# Altium schematic symbol library TI Amplifiers and Linear Special Function Amplifier.SchLib: 708 symbols (part 25 of 34)
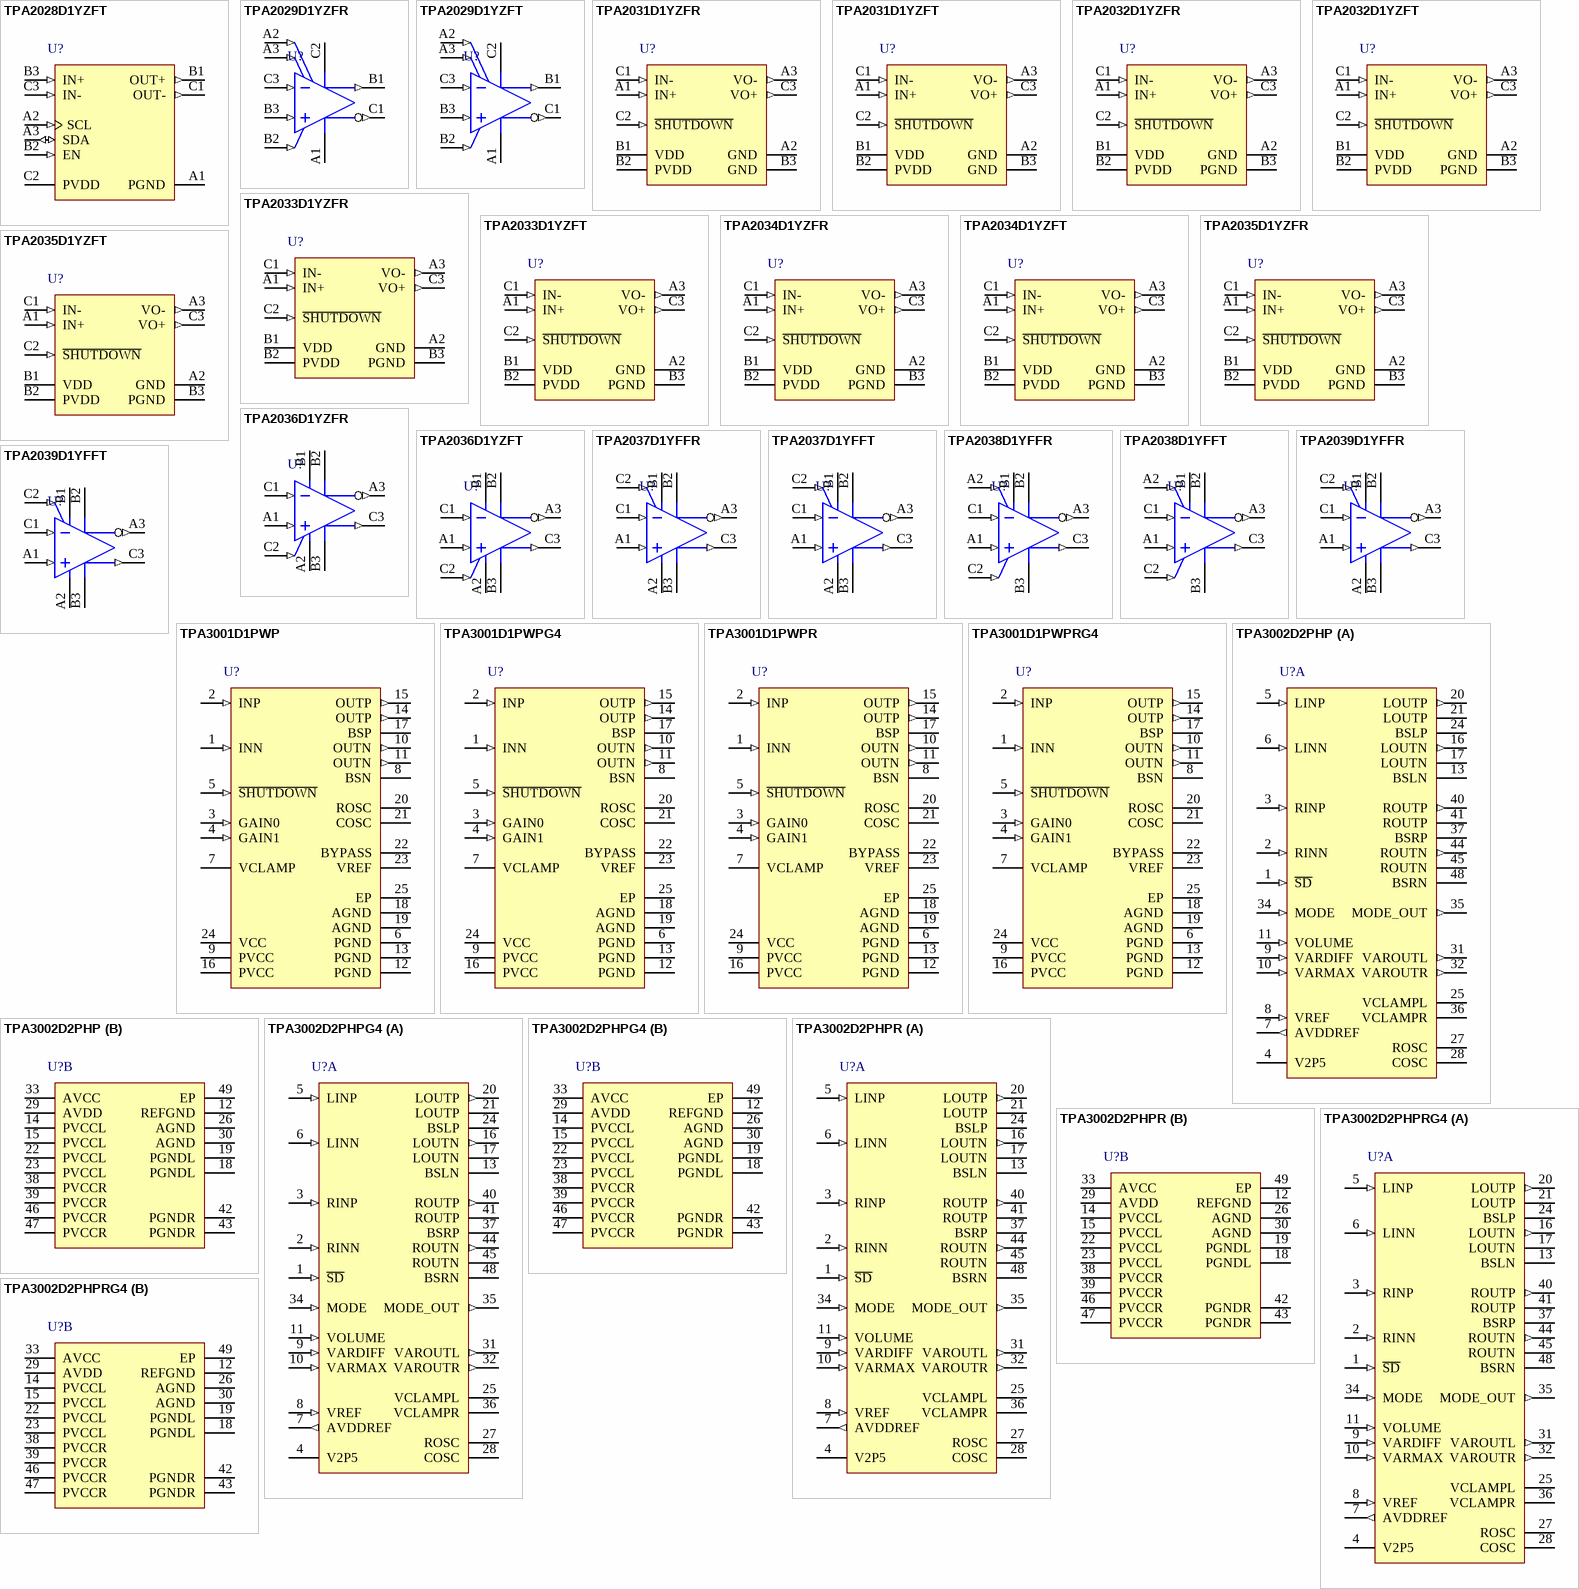
[diagram p63: symbols TPA2028D1YZFT to TPA3002D2PHPRG4]

## TPA2036D1YZFT
designator U?
2.5-W Mono Class-D Audio Amplifier with Variable Gain and Short Circuit Auto-Recovery, -40 to 85 degC, 9-pin BGA (YZF9), Green (RoHS & no Sb/Br); Manufacturer: Texas Instruments; PartNumber: TPA2036D1YZFT; Output Power(W): 2.5; PSRR(dB): -75; SubFamily: Dynamic Speaker; Supply Max(Max)(Volt): 5.5; DatasheetVersion: SLOS589; PackageVersion: 4205058-4/P, 07/2013; PackageReference: YZF9; PackageDescription: 9-Ball Silicon Grid Array, Body 1.625 x 1.625 mm, Pitch 0.5 mm; Supplier 1: Digi-Key; Supplier Part Number 1: 296-32456-2-ND; Supplier 2: Digi-Key; Supplier Part Number 2: 296-32456-1-ND; Supplier 3: Digi-Key; Supplier Part Number 3: 296-32456-6-ND; Supplier 4: Newark; Supplier Part Number 4: 19P7477; Supplier 5: Newark; Supplier Part Number 5: 08X6508; Supplier 6: Mouser; Supplier Part Number 6: 595-TPA2036D1YZFT; Eco-Plan: Green (RoHS & no Sb/Br); Speaker Amp Type: Class-D; Speaker Channels: Mono; Supply Min(Min)(Volt): 2.5; Mounting Technology: Surface Mount; ComponentLink1Description: Manufacturer URL; ComponentLink1URL: http://www.ti.com/; ComponentLink2Description: Datasheet; ComponentLink2URL: http://www.ti.com/general/docs/lit/getliterature.tsp?genericPartNumber=TPA2036D1&fileType=pdf; ComponentLink3Description: Package Specification; ComponentLink3URL: http://www.ti.com/lit/ml/mxbg027m/mxbg027m.pdf
footprint TI-YZF9 (BGA, 9-Leads, Body 1.6245x1.6245mm, Pitch 0.5mm)
pins: A1 IN+ (in) "Positive differential input", A2 GND (power) "High-current ground", A3 VO- (out) "Negative BTL output", B1 VDD (power) "Power supply", B2 VDD (power) "Power supply", B3 GND (power) "Positive BTL output", C1 IN- (in) "Negative differential input", C2 ~{SHUTDOWN} (in) "Shutdown terminal (active low logic)", C3 VO+ (out) "Positive BTL output"

## TPA2037D1YFFR
designator U?
Fixed Gain 3.2 W Mono Class-D with Integrated DAC Noise Filter, -40 to 85 degC, 9-pin BGA (YFF9), Green (RoHS & no Sb/Br); Manufacturer: Texas Instruments; PartNumber: TPA2037D1YFFR; Output Power(W): 3.24; PSRR(dB): 81; SubFamily: Dynamic Speaker; Supply Max(Max)(Volt): 5.5; Supply Min(Min)(Volt): 2.5; DatasheetVersion: SLOS648B; PackageVersion: 4207625-6/AL, 05/2013; PackageReference: YFF9; PackageDescription: 9-Ball Silicon Grid Array, Body 1.214 x 1.16 mm, Pitch 0.4 mm; Supplier 1: Digi-Key; Supplier Part Number 1: 296-25337-2-ND; Supplier 2: Digi-Key; Supplier Part Number 2: 296-25337-1-ND; Supplier 3: Digi-Key; Supplier Part Number 3: 296-25337-6-ND; Supplier 4: Mouser; Supplier Part Number 4: 595-TPA2037D1YFFR; Eco-Plan: Green (RoHS & no Sb/Br); Speaker Amp Type: Class-D; Speaker Channels: Mono; Mounting Technology: Surface Mount; ComponentLink1Description: Manufacturer URL; ComponentLink1URL: http://www.ti.com/; ComponentLink2Description: Datasheet; ComponentLink2URL: http://www.ti.com/general/docs/lit/getliterature.tsp?genericPartNumber=TPA2037D1&fileType=pdf; ComponentLink3Description: Package Specification; ComponentLink3URL: http://www.ti.com/litv/pdf/mxbg144
footprint TI-YFF9-1214X1160DE (BGA, 9-Balls, Body 1.214x1.16mm, Pitch 0.4mm)
pins: A1 IN+ (in) "Positive differential audio input", A2 GND (power) "Analog ground terminal. Must be connected to same potential as PGND using a direct connection to a single point ground.", A3 VO- (out) "Negative BTL audio output", B1 VDD (power) "Power supply terminal. Must be connected to same power supply as PVDD using a direct connection. Voltage must be within values listed in Recommended Operating Conditions table.", B2 PVDD (power) "High-current Power supply terminal. Must be connected to same power supply as VDD using a direct connection. Voltage must be within values listed in Recommended Operating Conditions table.", B3 PGND (power) "High-current Analog ground terminal. Must be connected to same potential as GND using a direct connection to a single point ground.", C1 IN- (in) "Negative differential audio input", C2 EN (in) "Shutdown terminal. When terminal is low the device is put into Shutdown mode.", C3 VO+ (out) "Positive BTL audio output"

## TPA2037D1YFFT
designator U?
Fixed Gain 3.2 W Mono Class-D with Integrated DAC Noise Filter, -40 to 85 degC, 9-pin BGA (YFF9), Green (RoHS & no Sb/Br); Manufacturer: Texas Instruments; PartNumber: TPA2037D1YFFT; Output Power(W): 3.24; PSRR(dB): 81; SubFamily: Dynamic Speaker; Supply Max(Max)(Volt): 5.5; Supply Min(Min)(Volt): 2.5; DatasheetVersion: SLOS648B; PackageVersion: 4207625-6/AL, 05/2013; PackageReference: YFF9; PackageDescription: 9-Ball Silicon Grid Array, Body 1.214 x 1.16 mm, Pitch 0.4 mm; Supplier 1: Digi-Key; Supplier Part Number 1: 296-25343-2-ND; Supplier 2: Digi-Key; Supplier Part Number 2: 296-25343-1-ND; Supplier 3: Digi-Key; Supplier Part Number 3: 296-25343-6-ND; Supplier 4: Newark; Supplier Part Number 4: 51R5928; Supplier 5: Mouser; Supplier Part Number 5: 595-TPA2037D1YFFT; Eco-Plan: Green (RoHS & no Sb/Br); Speaker Amp Type: Class-D; Speaker Channels: Mono; Mounting Technology: Surface Mount; ComponentLink1Description: Manufacturer URL; ComponentLink1URL: http://www.ti.com/; ComponentLink2Description: Datasheet; ComponentLink2URL: http://www.ti.com/general/docs/lit/getliterature.tsp?genericPartNumber=TPA2037D1&fileType=pdf; ComponentLink3Description: Package Specification; ComponentLink3URL: http://www.ti.com/litv/pdf/mxbg144
footprint TI-YFF9-1214X1160DE (BGA, 9-Balls, Body 1.214x1.16mm, Pitch 0.4mm)
pins: A1 IN+ (in) "Positive differential audio input", A2 GND (power) "Analog ground terminal. Must be connected to same potential as PGND using a direct connection to a single point ground.", A3 VO- (out) "Negative BTL audio output", B1 VDD (power) "Power supply terminal. Must be connected to same power supply as PVDD using a direct connection. Voltage must be within values listed in Recommended Operating Conditions table.", B2 PVDD (power) "High-current Power supply terminal. Must be connected to same power supply as VDD using a direct connection. Voltage must be within values listed in Recommended Operating Conditions table.", B3 PGND (power) "High-current Analog ground terminal. Must be connected to same potential as GND using a direct connection to a single point ground.", C1 IN- (in) "Negative differential audio input", C2 EN (in) "Shutdown terminal. When terminal is low the device is put into Shutdown mode.", C3 VO+ (out) "Positive BTL audio output"

## TPA2038D1YFFR
designator U?
Variable Gain 3.2 W Mono Class-D with Integrated DAC Noise Filter, -40 to 85 degC, 9-pin BGA (YFF9), Green (RoHS & no Sb/Br); Manufacturer: Texas Instruments; PartNumber: TPA2038D1YFFR; Output Power(W): 3.24; PSRR(dB): 81; SubFamily: Dynamic Speaker; Supply Max(Max)(Volt): 5.5; Supply Min(Min)(Volt): 2.5; DatasheetVersion: SLOS697A; PackageVersion: 4207625-6/AL, 05/2013; PackageReference: YFF9; PackageDescription: 9-Ball Silicon Grid Array, Body 1.214 x 1.16 mm, Pitch 0.4 mm; Supplier 1: Digi-Key; Supplier Part Number 1: 296-29701-2-ND; Supplier 2: Digi-Key; Supplier Part Number 2: 296-29701-1-ND; Supplier 3: Digi-Key; Supplier Part Number 3: 296-29701-6-ND; Supplier 4: Mouser; Supplier Part Number 4: 595-TPA2038D1YFFR; Eco-Plan: Green (RoHS & no Sb/Br); Speaker Amp Type: Class-D; Speaker Channels: Mono; Mounting Technology: Surface Mount; ComponentLink1Description: Manufacturer URL; ComponentLink1URL: http://www.ti.com/; ComponentLink2Description: Datasheet; ComponentLink2URL: http://www.ti.com/general/docs/lit/getliterature.tsp?genericPartNumber=TPA2038D1&fileType=pdf; ComponentLink3Description: Package Specification; ComponentLink3URL: http://www.ti.com/litv/pdf/mxbg144
footprint TI-YFF9-1214X1160DE (BGA, 9-Balls, Body 1.214x1.16mm, Pitch 0.4mm)
pins: A1 IN+ (in) "Positive audio input.", A2 GAIN (in) "Gain select. Set to GND for 12 dB; set to VDD for 6 dB.", A3 VO- (out) "Negative audio output.", B1 VDD (power) "Power supply terminal. Connect to PVDD using a direct connection.", B2 PVDD (power) "Class-D output power supply. Connect to VDD using a direct connection.", B3 PGND (power) "Ground.", C1 IN- (in) "Negative audio input.", C2 EN (in) "Enable. Set to logic high to enable device.", C3 VO+ (out) "Positive audio output."

## TPA2038D1YFFT
designator U?
Variable Gain 3.2 W Mono Class-D with Integrated DAC Noise Filter, -40 to 85 degC, 9-pin BGA (YFF9), Green (RoHS & no Sb/Br); Manufacturer: Texas Instruments; PartNumber: TPA2038D1YFFT; Output Power(W): 3.24; PSRR(dB): 81; SubFamily: Dynamic Speaker; Supply Max(Max)(Volt): 5.5; Supply Min(Min)(Volt): 2.5; DatasheetVersion: SLOS697A; PackageVersion: 4207625-6/AL, 05/2013; PackageReference: YFF9; PackageDescription: 9-Ball Silicon Grid Array, Body 1.214 x 1.16 mm, Pitch 0.4 mm; Supplier 1: Digi-Key; Supplier Part Number 1: TPA2038D1YFFT-ND; Supplier 2: Newark; Supplier Part Number 2: 71T5430; Supplier 3: Mouser; Supplier Part Number 3: 595-TPA2038D1YFFT; Eco-Plan: Green (RoHS & no Sb/Br); Speaker Amp Type: Class-D; Speaker Channels: Mono; Mounting Technology: Surface Mount; ComponentLink1Description: Manufacturer URL; ComponentLink1URL: http://www.ti.com/; ComponentLink2Description: Datasheet; ComponentLink2URL: http://www.ti.com/general/docs/lit/getliterature.tsp?genericPartNumber=TPA2038D1&fileType=pdf; ComponentLink3Description: Package Specification; ComponentLink3URL: http://www.ti.com/litv/pdf/mxbg144
footprint TI-YFF9-1214X1160DE (BGA, 9-Balls, Body 1.214x1.16mm, Pitch 0.4mm)
pins: A1 IN+ (in) "Positive audio input.", A2 GAIN (in) "Gain select. Set to GND for 12 dB; set to VDD for 6 dB.", A3 VO- (out) "Negative audio output.", B1 VDD (power) "Power supply terminal. Connect to PVDD using a direct connection.", B2 PVDD (power) "Class-D output power supply. Connect to VDD using a direct connection.", B3 PGND (power) "Ground.", C1 IN- (in) "Negative audio input.", C2 EN (in) "Enable. Set to logic high to enable device.", C3 VO+ (out) "Positive audio output."

## TPA2039D1YFFR
designator U?
Fixed Gain 3.2 W Mono Class-D with Integrated DAC Noise Filter, -40 to 85 degC, 9-pin BGA (YFF9), Green (RoHS & no Sb/Br); Manufacturer: Texas Instruments; PartNumber: TPA2039D1YFFR; Output Power(W): 3.24; PSRR(dB): 82; SubFamily: Dynamic Speaker; Supply Max(Max)(Volt): 5.5; Supply Min(Min)(Volt): 2.5; DatasheetVersion: SLOS652A; PackageVersion: 4207625-6/AL, 05/2013; PackageReference: YFF9; PackageDescription: 9-Ball Silicon Grid Array, Body 1.214 x 1.16 mm, Pitch 0.4 mm; Supplier 1: Digi-Key; Supplier Part Number 1: 296-25571-2-ND; Supplier 2: Digi-Key; Supplier Part Number 2: 296-25571-1-ND; Supplier 3: Digi-Key; Supplier Part Number 3: 296-25571-6-ND; Supplier 4: Newark; Supplier Part Number 4: 64R0727; Supplier 5: Mouser; Supplier Part Number 5: 595-TPA2039D1YFFR; Eco-Plan: Green (RoHS & no Sb/Br); Speaker Amp Type: Class-D; Speaker Channels: Mono; Mounting Technology: Surface Mount; ComponentLink1Description: Manufacturer URL; ComponentLink1URL: http://www.ti.com/; ComponentLink2Description: Datasheet; ComponentLink2URL: http://www.ti.com/general/docs/lit/getliterature.tsp?genericPartNumber=TPA2039D1&fileType=pdf; ComponentLink3Description: Package Specification; ComponentLink3URL: http://www.ti.com/litv/pdf/mxbg144
footprint TI-YFF9-1214X1160DE (BGA, 9-Balls, Body 1.214x1.16mm, Pitch 0.4mm)
pins: A1 IN+ (in) "Positive differential audio input", A2 GND (power) "Analog ground terminal. Must be connected to same potential as PGND using a direct connection to a single point ground.", A3 VO- (out) "Negative BTL audio output", B1 VDD (power) "Power supply terminal. Must be connected to same power supply as PVDD using a direct connection. Voltage must be within values listed in Recommended Operating Conditions table.", B2 PVDD (power) "High-current Power supply terminal. Must be connected to same power supply as VDD using a direct connection. Voltage must be within values listed in Recommended Operating Conditions table.", B3 PGND (power) "High-current Analog ground terminal. Must be connected to same potential as GND using a direct connection to a single point ground.", C1 IN- (in) "Negative differential audio input", C2 EN (in) "Shutdown terminal. When terminal is low the device is put into Shutdown mode.", C3 VO+ (out) "Positive BTL audio output"

## TPA2039D1YFFT
designator U?
Fixed Gain 3.2 W Mono Class-D with Integrated DAC Noise Filter, -40 to 85 degC, 9-pin BGA (YFF9), Green (RoHS & no Sb/Br); Manufacturer: Texas Instruments; PartNumber: TPA2039D1YFFT; Output Power(W): 3.24; PSRR(dB): 82; SubFamily: Dynamic Speaker; Supply Max(Max)(Volt): 5.5; Supply Min(Min)(Volt): 2.5; DatasheetVersion: SLOS652A; PackageVersion: 4207625-6/AL, 05/2013; PackageReference: YFF9; PackageDescription: 9-Ball Silicon Grid Array, Body 1.214 x 1.16 mm, Pitch 0.4 mm; Supplier 1: Digi-Key; Supplier Part Number 1: 296-32457-2-ND; Supplier 2: Digi-Key; Supplier Part Number 2: 296-32457-1-ND; Supplier 3: Digi-Key; Supplier Part Number 3: 296-32457-6-ND; Supplier 4: Newark; Supplier Part Number 4: 64R0728; Supplier 5: Mouser; Supplier Part Number 5: 595-TPA2039D1YFFT; Eco-Plan: Green (RoHS & no Sb/Br); Speaker Amp Type: Class-D; Speaker Channels: Mono; Mounting Technology: Surface Mount; ComponentLink1Description: Manufacturer URL; ComponentLink1URL: http://www.ti.com/; ComponentLink2Description: Datasheet; ComponentLink2URL: http://www.ti.com/general/docs/lit/getliterature.tsp?genericPartNumber=TPA2039D1&fileType=pdf; ComponentLink3Description: Package Specification; ComponentLink3URL: http://www.ti.com/litv/pdf/mxbg144
footprint TI-YFF9-1214X1160DE (BGA, 9-Balls, Body 1.214x1.16mm, Pitch 0.4mm)
pins: A1 IN+ (in) "Positive differential audio input", A2 GND (power) "Analog ground terminal. Must be connected to same potential as PGND using a direct connection to a single point ground.", A3 VO- (out) "Negative BTL audio output", B1 VDD (power) "Power supply terminal. Must be connected to same power supply as PVDD using a direct connection. Voltage must be within values listed in Recommended Operating Conditions table.", B2 PVDD (power) "High-current Power supply terminal. Must be connected to same power supply as VDD using a direct connection. Voltage must be within values listed in Recommended Operating Conditions table.", B3 PGND (power) "High-current Analog ground terminal. Must be connected to same potential as GND using a direct connection to a single point ground.", C1 IN- (in) "Negative differential audio input", C2 EN (in) "Shutdown terminal. When terminal is low the device is put into Shutdown mode.", C3 VO+ (out) "Positive BTL audio output"

## TPA3001D1PWP
designator U?
20 W Mono Class-D Audio Power Amplifier, -40 to 85 degC, 24-pin SOP (PWP24), Green (RoHS & no Sb/Br); Manufacturer: Texas Instruments; PartNumber: TPA3001D1PWP; Analog Supply Max [V]: 18; Analog Supply Min [V]: 8; Input Type: Analog; Max. Number of Speaker Outputs: 1; SubFamily: Mid/High-Power Amplifier; DatasheetVersion: SLOS398E; PackageVersion: 4073225-5/I, 05/2011; PackageReference: PWP24-4420X1950TP; PackageDescription: 24-Pin Plastic Small Outline, Body 4.4 x 7.8 mm, Pitch 0.65 mm; Supplier 1: Digi-Key; Supplier Part Number 1: 296-26879-5-ND; Supplier 2: Newark; Supplier Part Number 2: 72K9590; Supplier 3: Mouser; Supplier Part Number 3: 595-TPA3001D1PWP; Eco-Plan: Green (RoHS & no Sb/Br); Power Stage Supply Min(V): 8; Mounting Technology: Surface Mount; Code_JEDEC: MO-153; ComponentLink1Description: Manufacturer URL; ComponentLink1URL: http://www.ti.com/; ComponentLink2Description: Datasheet; ComponentLink2URL: http://www.ti.com/general/docs/lit/getliterature.tsp?genericPartNumber=TPA3001D1&fileType=pdf; ComponentLink3Description: Package Specification; ComponentLink3URL: http://www.ti.com/lit/ds/symlink/tps65101.pdf
footprint TI-PWP24-4420X1950TP_N (SOP, 24-Leads, Body 7.9x4.5mm, Pitch 0.65mm, Thermal Pad 4.87x2.4mm, IPC Medium Density)
footprint TI-PWP24-4420X1950TP_L (SOP, 24-Leads, Body 7.9x4.5mm, Pitch 0.65mm, Thermal Pad 4.87x2.4mm, IPC High Density)
footprint TI-PWP24-4420X1950TP_M (SOP, 24-Leads, Body 7.9x4.5mm, Pitch 0.65mm, Thermal Pad 4.87x2.4mm, IPC Low Density)
pins: 1 INN (in) "Negative differential input", 2 INP (in) "Positive differential input", 3 GAIN0 (in) "Bit 0 of gain control (see Table 1 for gain settings)", 4 GAIN1 (in) "Bit 1 of gain control (see Table 1 for gain settings)", 5 ~{SHUTDOWN} (in) "Shutdown terminal (negative logic), TTL compatible, 21-V compliant", 6 PGND (power) "Power ground", 7 VCLAMP "Connect 1-uF capacitor to ground to provide reference voltage for H-bridge gates", 8 BSN "Bootstrap terminal for high-side gate drive of negative BTL output (connect a 0.22-uF capacitor with a 51-ohm resistor in series from OUTN to BSN)", 9 PVCC (power) "High-voltage power supply (for output stages)", 10 OUTN (out) "Negative BTL output, connect Schottky diode from PGND to OUTN for short-circuit protection", 11 OUTN (out) "Negative BTL output, connect Schottky diode from PGND to OUTN for short-circuit protection", 12 PGND (power) "Power ground", 13 PGND (power) "Power ground", 14 OUTP (out) "Positive BTL output, connect Schottky diode from PGND to OUTP for short-circuit protection", 15 OUTP (out) "Positive BTL output, connect Schottky diode from PGND to OUTP for short-circuit protection", 16 PVCC (power) "High-voltage power supply (for output stages)", 17 BSP "Bootstrap terminal for high-side gate drive of positive BTL output (connect a 0.22-uF capacitor with a 51-ohm resistor in series from OUTP to BSP)", 18 AGND (power) "Analog ground terminal", 19 AGND (power) "Analog ground terminal", 20 ROSC "Connect a 120-kohm resistor to ground to set oscillation frequency", 21 COSC "Connect a 220-pF capacitor to ground to set oscillation frequency", 22 BYPASS "Connect 1-uF capacitor to ground for BYPASS voltage filtering", 23 VREF "5-V internal regulator for control circuitry (connect a 0.1-uF to 1-uF capacitor to ground)", 24 VCC (power) "Analog high-voltage power supply", 25 EP (power) "Connect to AGND and PGND - should be star point for both grounds. Internal resistive connection to AGND. Thermal vias on the PCB should connect this pad to a large copper area on an internal or bottom layer for the best (See Datasheet)"

## TPA3001D1PWPG4
designator U?
20 W Mono Class-D Audio Power Amplifier, -40 to 85 degC, 24-pin SOP (PWP24), Green (RoHS & no Sb/Br); Manufacturer: Texas Instruments; PartNumber: TPA3001D1PWPG4; Analog Supply Max [V]: 18; Analog Supply Min [V]: 8; Input Type: Analog; Max. Number of Speaker Outputs: 1; SubFamily: Mid/High-Power Amplifier; DatasheetVersion: SLOS398E; PackageVersion: 4073225-5/I, 05/2011; PackageReference: PWP24-4420X1950TP; PackageDescription: 24-Pin Plastic Small Outline, Body 4.4 x 7.8 mm, Pitch 0.65 mm; Supplier 1: Digi-Key; Supplier Part Number 1: TPA3001D1PWPG4-ND; Supplier 2: Farnell; Supplier Part Number 2: 1207310; Supplier 3: Newark; Supplier Part Number 3: 24M8502; Supplier 4: Newark; Supplier Part Number 4: 58K6873; Supplier 5: Mouser; Supplier Part Number 5: 595-TPA3001D1PWPG4; Eco-Plan: Green (RoHS & no Sb/Br); Power Stage Supply Min(V): 8; Mounting Technology: Surface Mount; Code_JEDEC: MO-153; ComponentLink1Description: Manufacturer URL; ComponentLink1URL: http://www.ti.com/; ComponentLink2Description: Datasheet; ComponentLink2URL: http://www.ti.com/general/docs/lit/getliterature.tsp?genericPartNumber=TPA3001D1&fileType=pdf; ComponentLink3Description: Package Specification; ComponentLink3URL: http://www.ti.com/lit/ds/symlink/tps65101.pdf
footprint TI-PWP24-4420X1950TP_N (SOP, 24-Leads, Body 7.9x4.5mm, Pitch 0.65mm, Thermal Pad 4.87x2.4mm, IPC Medium Density)
footprint TI-PWP24-4420X1950TP_L (SOP, 24-Leads, Body 7.9x4.5mm, Pitch 0.65mm, Thermal Pad 4.87x2.4mm, IPC High Density)
footprint TI-PWP24-4420X1950TP_M (SOP, 24-Leads, Body 7.9x4.5mm, Pitch 0.65mm, Thermal Pad 4.87x2.4mm, IPC Low Density)
pins: 1 INN (in) "Negative differential input", 2 INP (in) "Positive differential input", 3 GAIN0 (in) "Bit 0 of gain control (see Table 1 for gain settings)", 4 GAIN1 (in) "Bit 1 of gain control (see Table 1 for gain settings)", 5 ~{SHUTDOWN} (in) "Shutdown terminal (negative logic), TTL compatible, 21-V compliant", 6 PGND (power) "Power ground", 7 VCLAMP "Connect 1-uF capacitor to ground to provide reference voltage for H-bridge gates", 8 BSN "Bootstrap terminal for high-side gate drive of negative BTL output (connect a 0.22-uF capacitor with a 51-ohm resistor in series from OUTN to BSN)", 9 PVCC (power) "High-voltage power supply (for output stages)", 10 OUTN (out) "Negative BTL output, connect Schottky diode from PGND to OUTN for short-circuit protection", 11 OUTN (out) "Negative BTL output, connect Schottky diode from PGND to OUTN for short-circuit protection", 12 PGND (power) "Power ground", 13 PGND (power) "Power ground", 14 OUTP (out) "Positive BTL output, connect Schottky diode from PGND to OUTP for short-circuit protection", 15 OUTP (out) "Positive BTL output, connect Schottky diode from PGND to OUTP for short-circuit protection", 16 PVCC (power) "High-voltage power supply (for output stages)", 17 BSP "Bootstrap terminal for high-side gate drive of positive BTL output (connect a 0.22-uF capacitor with a 51-ohm resistor in series from OUTP to BSP)", 18 AGND (power) "Analog ground terminal", 19 AGND (power) "Analog ground terminal", 20 ROSC "Connect a 120-kohm resistor to ground to set oscillation frequency", 21 COSC "Connect a 220-pF capacitor to ground to set oscillation frequency", 22 BYPASS "Connect 1-uF capacitor to ground for BYPASS voltage filtering", 23 VREF "5-V internal regulator for control circuitry (connect a 0.1-uF to 1-uF capacitor to ground)", 24 VCC (power) "Analog high-voltage power supply", 25 EP (power) "Connect to AGND and PGND - should be star point for both grounds. Internal resistive connection to AGND. Thermal vias on the PCB should connect this pad to a large copper area on an internal or bottom layer for the best (See Datasheet)"

## TPA3001D1PWPR
designator U?
20 W Mono Class-D Audio Power Amplifier, -40 to 85 degC, 24-pin SOP (PWP24), Green (RoHS & no Sb/Br); Manufacturer: Texas Instruments; PartNumber: TPA3001D1PWPR; Analog Supply Max [V]: 18; Analog Supply Min [V]: 8; Input Type: Analog; Max. Number of Speaker Outputs: 1; SubFamily: Mid/High-Power Amplifier; DatasheetVersion: SLOS398E; PackageVersion: 4073225-5/I, 05/2011; PackageReference: PWP24-4420X1950TP; PackageDescription: 24-Pin Plastic Small Outline, Body 4.4 x 7.8 mm, Pitch 0.65 mm; Supplier 1: Digi-Key; Supplier Part Number 1: 296-14200-2-ND; Supplier 2: Digi-Key; Supplier Part Number 2: 296-14200-1-ND; Supplier 3: Digi-Key; Supplier Part Number 3: 296-14200-6-ND; Supplier 4: Farnell; Supplier Part Number 4: 1575458; Supplier 5: Newark; Supplier Part Number 5: 74K3973; Supplier 6: Mouser; Supplier Part Number 6: 595-TPA3001D1PWPR; Eco-Plan: Green (RoHS & no Sb/Br); Power Stage Supply Min(V): 8; Mounting Technology: Surface Mount; Code_JEDEC: MO-153; ComponentLink1Description: Manufacturer URL; ComponentLink1URL: http://www.ti.com/; ComponentLink2Description: Datasheet; ComponentLink2URL: http://www.ti.com/general/docs/lit/getliterature.tsp?genericPartNumber=TPA3001D1&fileType=pdf; ComponentLink3Description: Package Specification; ComponentLink3URL: http://www.ti.com/lit/ds/symlink/tps65101.pdf
footprint TI-PWP24-4420X1950TP_N (SOP, 24-Leads, Body 7.9x4.5mm, Pitch 0.65mm, Thermal Pad 4.87x2.4mm, IPC Medium Density)
footprint TI-PWP24-4420X1950TP_L (SOP, 24-Leads, Body 7.9x4.5mm, Pitch 0.65mm, Thermal Pad 4.87x2.4mm, IPC High Density)
footprint TI-PWP24-4420X1950TP_M (SOP, 24-Leads, Body 7.9x4.5mm, Pitch 0.65mm, Thermal Pad 4.87x2.4mm, IPC Low Density)
pins: 1 INN (in) "Negative differential input", 2 INP (in) "Positive differential input", 3 GAIN0 (in) "Bit 0 of gain control (see Table 1 for gain settings)", 4 GAIN1 (in) "Bit 1 of gain control (see Table 1 for gain settings)", 5 ~{SHUTDOWN} (in) "Shutdown terminal (negative logic), TTL compatible, 21-V compliant", 6 PGND (power) "Power ground", 7 VCLAMP "Connect 1-uF capacitor to ground to provide reference voltage for H-bridge gates", 8 BSN "Bootstrap terminal for high-side gate drive of negative BTL output (connect a 0.22-uF capacitor with a 51-ohm resistor in series from OUTN to BSN)", 9 PVCC (power) "High-voltage power supply (for output stages)", 10 OUTN (out) "Negative BTL output, connect Schottky diode from PGND to OUTN for short-circuit protection", 11 OUTN (out) "Negative BTL output, connect Schottky diode from PGND to OUTN for short-circuit protection", 12 PGND (power) "Power ground", 13 PGND (power) "Power ground", 14 OUTP (out) "Positive BTL output, connect Schottky diode from PGND to OUTP for short-circuit protection", 15 OUTP (out) "Positive BTL output, connect Schottky diode from PGND to OUTP for short-circuit protection", 16 PVCC (power) "High-voltage power supply (for output stages)", 17 BSP "Bootstrap terminal for high-side gate drive of positive BTL output (connect a 0.22-uF capacitor with a 51-ohm resistor in series from OUTP to BSP)", 18 AGND (power) "Analog ground terminal", 19 AGND (power) "Analog ground terminal", 20 ROSC "Connect a 120-kohm resistor to ground to set oscillation frequency", 21 COSC "Connect a 220-pF capacitor to ground to set oscillation frequency", 22 BYPASS "Connect 1-uF capacitor to ground for BYPASS voltage filtering", 23 VREF "5-V internal regulator for control circuitry (connect a 0.1-uF to 1-uF capacitor to ground)", 24 VCC (power) "Analog high-voltage power supply", 25 EP (power) "Connect to AGND and PGND - should be star point for both grounds. Internal resistive connection to AGND. Thermal vias on the PCB should connect this pad to a large copper area on an internal or bottom layer for the best (See Datasheet)"

## TPA3001D1PWPRG4
designator U?
20 W Mono Class-D Audio Power Amplifier, -40 to 85 degC, 24-pin SOP (PWP24), Green (RoHS & no Sb/Br); Manufacturer: Texas Instruments; PartNumber: TPA3001D1PWPRG4; Analog Supply Max [V]: 18; Analog Supply Min [V]: 8; Input Type: Analog; Max. Number of Speaker Outputs: 1; SubFamily: Mid/High-Power Amplifier; DatasheetVersion: SLOS398E; PackageVersion: 4073225-5/I, 05/2011; PackageReference: PWP24-4420X1950TP; PackageDescription: 24-Pin Plastic Small Outline, Body 4.4 x 7.8 mm, Pitch 0.65 mm; Supplier 1: Digi-Key; Supplier Part Number 1: TPA3001D1PWPRG4-ND; Supplier 2: Newark; Supplier Part Number 2: 08K4918; Supplier 3: Mouser; Supplier Part Number 3: 595-TPA3001D1PWPRG4; Eco-Plan: Green (RoHS & no Sb/Br); Power Stage Supply Min(V): 8; Mounting Technology: Surface Mount; Code_JEDEC: MO-153; ComponentLink1Description: Manufacturer URL; ComponentLink1URL: http://www.ti.com/; ComponentLink2Description: Datasheet; ComponentLink2URL: http://www.ti.com/general/docs/lit/getliterature.tsp?genericPartNumber=TPA3001D1&fileType=pdf; ComponentLink3Description: Package Specification; ComponentLink3URL: http://www.ti.com/lit/ds/symlink/tps65101.pdf
footprint TI-PWP24-4420X1950TP_N (SOP, 24-Leads, Body 7.9x4.5mm, Pitch 0.65mm, Thermal Pad 4.87x2.4mm, IPC Medium Density)
footprint TI-PWP24-4420X1950TP_L (SOP, 24-Leads, Body 7.9x4.5mm, Pitch 0.65mm, Thermal Pad 4.87x2.4mm, IPC High Density)
footprint TI-PWP24-4420X1950TP_M (SOP, 24-Leads, Body 7.9x4.5mm, Pitch 0.65mm, Thermal Pad 4.87x2.4mm, IPC Low Density)
pins: 1 INN (in) "Negative differential input", 2 INP (in) "Positive differential input", 3 GAIN0 (in) "Bit 0 of gain control (see Table 1 for gain settings)", 4 GAIN1 (in) "Bit 1 of gain control (see Table 1 for gain settings)", 5 ~{SHUTDOWN} (in) "Shutdown terminal (negative logic), TTL compatible, 21-V compliant", 6 PGND (power) "Power ground", 7 VCLAMP "Connect 1-uF capacitor to ground to provide reference voltage for H-bridge gates", 8 BSN "Bootstrap terminal for high-side gate drive of negative BTL output (connect a 0.22-uF capacitor with a 51-ohm resistor in series from OUTN to BSN)", 9 PVCC (power) "High-voltage power supply (for output stages)", 10 OUTN (out) "Negative BTL output, connect Schottky diode from PGND to OUTN for short-circuit protection", 11 OUTN (out) "Negative BTL output, connect Schottky diode from PGND to OUTN for short-circuit protection", 12 PGND (power) "Power ground", 13 PGND (power) "Power ground", 14 OUTP (out) "Positive BTL output, connect Schottky diode from PGND to OUTP for short-circuit protection", 15 OUTP (out) "Positive BTL output, connect Schottky diode from PGND to OUTP for short-circuit protection", 16 PVCC (power) "High-voltage power supply (for output stages)", 17 BSP "Bootstrap terminal for high-side gate drive of positive BTL output (connect a 0.22-uF capacitor with a 51-ohm resistor in series from OUTP to BSP)", 18 AGND (power) "Analog ground terminal", 19 AGND (power) "Analog ground terminal", 20 ROSC "Connect a 120-kohm resistor to ground to set oscillation frequency", 21 COSC "Connect a 220-pF capacitor to ground to set oscillation frequency", 22 BYPASS "Connect 1-uF capacitor to ground for BYPASS voltage filtering", 23 VREF "5-V internal regulator for control circuitry (connect a 0.1-uF to 1-uF capacitor to ground)", 24 VCC (power) "Analog high-voltage power supply", 25 EP (power) "Connect to AGND and PGND - should be star point for both grounds. Internal resistive connection to AGND. Thermal vias on the PCB should connect this pad to a large copper area on an internal or bottom layer for the best (See Datasheet)"
